# Altium footprint library LUMI_Standard_Auto_Soldering_LIB.PcbLib: 344 footprints (part 2 of 22)
Each footprint in its own frame and in the unit in brackets; x right, y up, seen from the top. Pads: shape width x height; smd on the part's side, far side on the other; paste and mask are expansions set on the pad; w line width, h text height; cw(c..) or ccw(c..) is an arc to the next point about the centre after c.
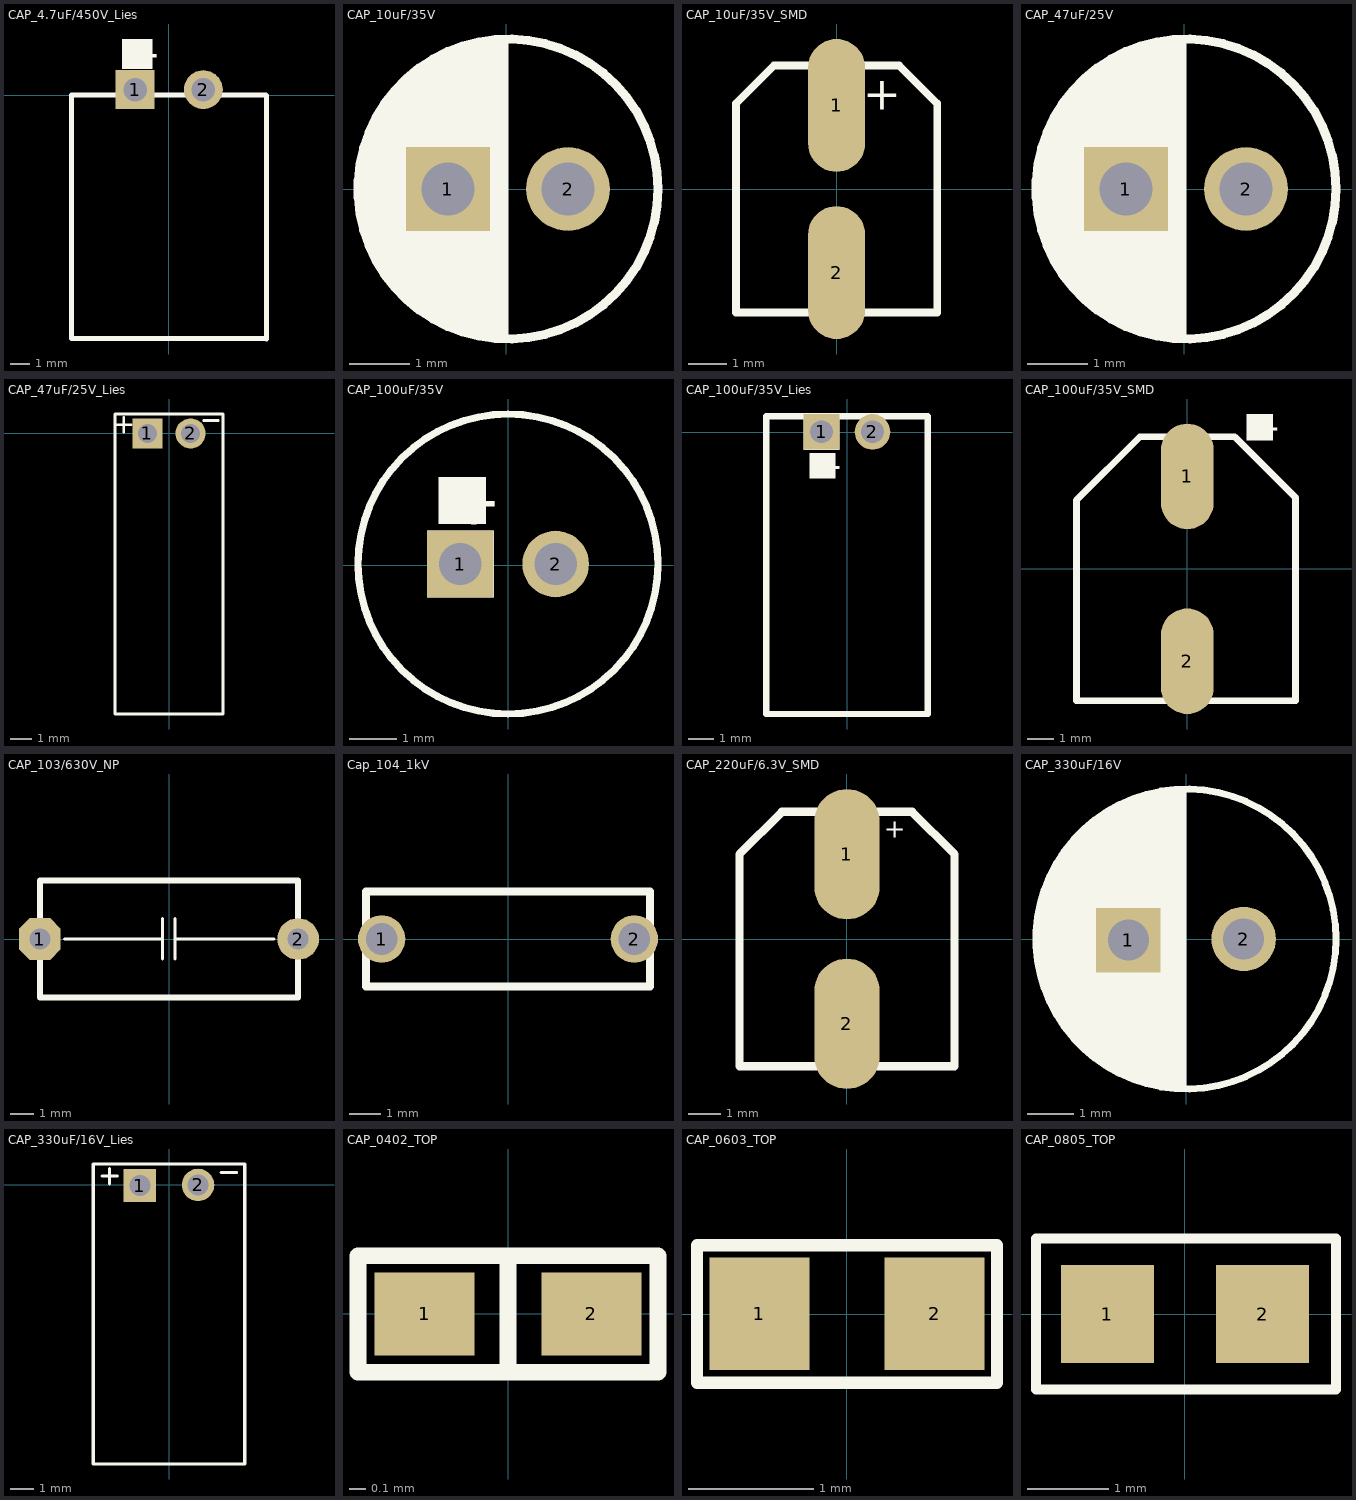
[diagram p1: the footprints below, top view; thin cyan lines are the x and y axes]

## CAP_4.7uF/450V_Lies [mm]
pads (2):
  rect 2x2 hole 1.2: 1(-1.726,0.277)
  round 2 hole 1.2: 2(1.774,0.277)
Top Overlay:
  pour cut-out: -2.378,1.354 -0.854,1.354 -0.854,2.878 -2.378,2.878
  lines w0.254: 5.002,-12.5 -5,-12.5 -5,0 5.002,0 ; 5.025,-12.523 5.025,-0.023
  text "+" at -2.124,1.354 h1.52
3D body: height 9.99, standoff 0.01, extent -4.961,-12.5 5,0
3D body: height 1, standoff -2, extent -2.222,-0.222 -1.226,0.776
3D body: height 1, standoff -2, extent 1.278,-0.222 2.274,0.776

## CAP_10uF/35V [mm]
pads (2):
  rect 1.4x1.4 hole 0.889: 1(-0.975,0)
  round 1.397 hole 0.889: 2(1.025,0)
Top Overlay:
  circle w0.15: c0.025,0 r2.5
  pour cut-out: -1.427,0.842 -0.445,0.842 -0.445,1.824 -1.427,1.824
  pour cut-out: -1.675,-0.7 -0.275,-0.7 -0.275,0.7 -1.675,0.7
  region: -0.025,2.475 0.025,2.454 0.025,-2.5 -0.375,-2.5 -0.475,-2.4 -0.675,-2.4 -0.775,-2.3 -1.075,-2.3 -1.375,-2 -1.575,-2 -1.875,-1.7 -1.875,-1.6 -2.075,-1.4 -2.075,-1.3 -2.275,-1.1 -2.275,-0.9 -2.375,-0.8 -2.375,-0.6 -2.475,-0.5 -2.475,0.4 -2.375,0.5 -2.375,0.825 -2.225,0.975 -2.225,1.2 -2.1,1.325 -2.1,1.4 -2.075,1.4 -1.85,1.625 -1.85,1.75 -1.775,1.75 -1.575,1.95 -1.525,1.95 -1.325,2.15 -1.125,2.15 -0.925,2.35 -0.6,2.35 -0.475,2.475 hole: -0.445,1.824 -1.427,1.824 -1.427,0.842 -0.445,0.842 hole: -0.275,0.7 -1.675,0.7 -1.675,-0.7 -0.275,-0.7
  text "+" at -1.275,0.825 h1.02
3D body: height 0.76, standoff -11.97, extent -2.576,-2.567 2.63,2.577

## CAP_10uF/35V_SMD [mm]
pads (2):
  oval 1.5x3.5 smd: 1(0,2.2) 2(0,-2.2)
Top Overlay:
  lines w0.203: -2.65,-3.25 -2.65,2.25 -1.65,3.25 1.65,3.25 2.65,2.25 2.65,-3.25 -2.65,-3.25
  text "+" at 1.7,1.8 h1.5
3D body: height 5.4, standoff 0, extent -2.5,-2.495 2.48,2.495
3D body: height 1, standoff 0, extent -2.6,-3.3 2.6,3.25

## CAP_47uF/25V [mm]
pads (2):
  rect 1.4x1.4 hole 0.889: 1(-0.975,0)
  round 1.397 hole 0.889: 2(1.025,0)
Top Overlay:
  circle w0.15: c0.025,0 r2.5
  region: -0.025,2.475 0.025,2.454 0.025,-2.5 -0.375,-2.5 -0.475,-2.4 -0.675,-2.4 -0.775,-2.3 -1.075,-2.3 -1.375,-2 -1.575,-2 -1.875,-1.7 -1.875,-1.6 -2.075,-1.4 -2.075,-1.3 -2.275,-1.1 -2.275,-0.9 -2.375,-0.8 -2.375,-0.6 -2.475,-0.5 -2.475,0.4 -2.375,0.5 -2.375,0.825 -2.225,0.975 -2.225,1.2 -2.1,1.325 -2.1,1.4 -2.075,1.4 -1.85,1.625 -1.85,1.75 -1.775,1.75 -1.575,1.95 -1.525,1.95 -1.325,2.15 -1.125,2.15 -0.925,2.35 -0.6,2.35 -0.475,2.475 hole: -0.445,1.824 -1.427,1.824 -1.427,0.842 -0.445,0.842 hole: -0.275,0.7 -1.675,0.7 -1.675,-0.7 -0.275,-0.7
  pour cut-out: -1.675,-0.7 -0.275,-0.7 -0.275,0.7 -1.675,0.7
  pour cut-out: -1.427,0.842 -0.445,0.842 -0.445,1.824 -1.427,1.824
  text "+" at -1.275,0.825 h1.02
3D body: height 0.76, standoff -11.97, extent -2.576,-2.567 2.63,2.577

## CAP_47uF/25V_Lies [mm]
pads (2):
  rect 1.4x1.4 hole 0.889: 1(-1,0)
  round 1.4 hole 0.889: 2(1,0)
Top Overlay:
  lines w0.127: -2.438,0.4 -1.763,0.4 ; -2.1,0.062 -2.1,0.737 ; 1.613,0.6 2.288,0.6
  lines w0.15: -2.5,-13 2.5,-13 2.5,0.9 -2.5,0.9 -2.5,-13
3D body: height -0.43, standoff -5.58, extent -2.606,-12.963 2.6,-0.237

## CAP_100uF/35V [mm]
pads (2):
  rect 1.4x1.4 hole 0.889: 1(-1,0.023)
  round 1.397 hole 0.889: 2(1,0.023)
Top Overlay:
  circle w0.15: c0,0.023 r3.15
  pour cut-out: -1.452,0.865 -0.47,0.865 -0.47,1.847 -1.452,1.847
  pour cut-out: -1.7,-0.677 -0.3,-0.677 -0.3,0.723 -1.7,0.723
  text "+" at -1.3,0.848 h1.02
3D body: height 11, standoff 0, extent -3.125,-3.144 3.15,3.144
3D body: height 1, standoff -2, extent 0.504,-0.476 1.5,0.522
3D body: height 1, standoff -2, extent -1.496,-0.476 -0.5,0.522

## CAP_100uF/35V_Lies [mil]
pads (2):
  rect 55.12x55.12 hole 35: 1(-39.37,0.9)
  round 55 hole 35: 2(39.37,0.9)
Top Overlay:
  pour cut-out: -66.93,-26.66 -11.81,-26.66 -11.81,28.46 -66.93,28.46
  pour cut-out: -57.18,-70.95 -18.53,-70.95 -18.53,-32.29 -57.18,-32.29
  lines w10: -125,-435 125,-435 125,1.89 125,25 -125,25 -125,0 -125,-435
  text "+" at -51.18,-71.62 h40
3D body: height 39.37, standoff -78.74, extent -58.9,-18.74 -19.68,20.55
3D body: height 39.37, standoff -78.74, extent 19.84,-18.74 59.06,20.55
3D body: height 249.76, standoff 2.21, extent -123.03,-433.06 124.02,0.01

## CAP_100uF/35V_SMD [mm]
pads (2):
  oval 2x4 smd: 1(0,3.5) 2(0,-3.5)
Top Overlay:
  pour cut-out: 2.248,4.865 3.229,4.865 3.229,5.847 2.248,5.847
  lines w0.254: -4.2,-5 4.1,-5 4.1,2.7 1.8,5 -1.8,5 -4.2,2.6 -4.2,-5
  text "+" at 2.4,4.848 h1.02
3D body: height 1.6, standoff 0, extent -4.2,-5 4.1,5
3D body: height 10.3, standoff 0.1, extent -3.968,-3.992 4,3.992

## CAP_103/630V_NP [mil]
pads (2):
  oct 70x70 hole 35: 1(-216.54,0)
  round 70 hole 35: 2(216.54,0)
Top Overlay:
  lines w5: -175.2,0 -10.83,0 ; -10.83,-33.46 -10.83,34.45 ; 9.84,-33.46 9.84,34.45 ; 9.84,0 176.18,0
  lines w10: -216.54,-98.43 -216.54,98.43 216.54,98.43 216.54,-98.43 -216.54,-98.43

## Cap_104_1kV [mm]
pads (2):
  round 1.5 hole 1 mask+0.07: 1(-4,0) 2(4,0)
Top Overlay:
  lines w0.254: -4.5,-1.5 -4.5,1.5 4.5,1.5 4.5,-1.5 -4.5,-1.5
3D body: height 12, standoff -2.5, extent -5.498,-1.714 5.498,1.8

## CAP_220uF/6.3V_SMD [mm]
pads (2):
  oval 2x4 smd: 1(0,2.6) 2(0,-2.6)
Top Overlay:
  lines w0.254: -3.3,-3.9 3.3,-3.9 3.3,2.6 2,3.9 -2,3.9 -3.3,2.6 -3.3,-3.9
  text "+" at 1.8,2.9 h1
3D body: height 5.8, standoff 0, extent -3.125,-3.144 3.15,3.144
3D body: height 1, standoff 0, extent -3.3,-3.9 3.3,3.9

## CAP_330uF/16V [mil]
pads (2):
  rect 55x55 hole 35: 1(-49.21,-0.99)
  round 55 hole 35: 2(49.21,0)
Top Overlay:
  circle w5.91: c0,0 r127.95
  region: 0,-126.15 -1.97,-126.97 -20.67,-126.97 -21.65,-125.98 -23.62,-124.02 -34.45,-124.02 -36.42,-122.05 -38.39,-120.08 -47.24,-120.08 -50.2,-117.13 -53.15,-114.17 -61.02,-114.17 -64.96,-110.24 -69.88,-105.31 -73.82,-105.31 -76.77,-102.36 -107.28,-71.85 -107.28,-66.93 -108.27,-66.93 -113.19,-62.01 -115.16,-60.04 -115.16,-56.1 -115.16,-52.17 -118.11,-49.21 -121.06,-46.26 -121.06,-42.32 -121.06,-38.39 -123.03,-36.42 -124.02,-35.43 -124.02,-30.51 -124.02,-26.57 -125.98,-24.61 -126.97,-23.62 -126.97,-18.7 -126.97,-13.78 -127.95,-12.8 -127.95,0 -127.95,11.81 -126.97,12.8 -126.97,21.65 -126.97,24.61 -125,26.57 -123.03,28.54 -123.03,35.43 -123.03,40.35 -120.08,43.31 -118.11,45.28 -118.11,50.2 -118.11,54.13 -116.14,56.1 -112.2,60.04 -112.2,62.99 -112.2,63.98 -108.27,67.91 -106.3,69.88 -106.3,73.82 -101.38,78.74 -96.46,83.66 -96.46,84.65 -89.57,91.54 -85.63,95.47 -83.66,95.47 -73.82,105.31 -70.87,108.27 -66.93,108.27 -62.01,113.19 -60.04,115.16 -51.18,115.16 -48.23,118.11 -46.26,120.08 -37.4,120.08 -32.48,125 -12.8,125 -10.83,126.97 -9.84,127.95 0,127.95 hole: -31.32,76.72 -69.98,76.72 -69.98,38.07 -31.32,38.07 hole: -21.65,26.57 -76.77,26.57 -76.77,-28.54 -21.65,-28.54
  pour cut-out: -76.77,-28.54 -21.65,-28.54 -21.65,26.57 -76.77,26.57
  pour cut-out: -69.98,38.07 -31.32,38.07 -31.32,76.72 -69.98,76.72
  text "+" at -63.98,37.4 h40
3D body: height 29.82, standoff -471.19, extent -101.4,-102.04 103.54,100.48

## CAP_330uF/16V_Lies [mm]
pads (2):
  rect 1.4x1.4 hole 0.889: 1(-1.25,-0.025)
  round 1.4 hole 0.889: 2(1.25,0)
Top Overlay:
  lines w0.127: -2.887,0.375 -2.213,0.375 ; -2.55,0.038 -2.55,0.713 ; 2.238,0.525 2.913,0.525
  lines w0.15: -3.25,-12 -3.25,0.9 3.25,0.9 3.25,-12 -3.25,-12
3D body: height 5.99, standoff 0.01, extent -2.976,-12 3,0
3D body: height -0.43, standoff -5.58, extent -2.606,-11.963 2.6,0.763

## CAP_0402_TOP [mm]
pads (2):
  rect 0.6x0.5 smd: 1(-0.5,0) 2(0.5,0)
Top Overlay:
  lines w0.1: 0,-0.3 0,0.3 ; -0.9,-0.35 -0.9,0.35 0.9,0.35 0.9,-0.35 -0.9,-0.35
3D body: height 0.2, standoff 0, extent -0.5,-0.3 0.5,0.3

## CAP_0603_TOP [mm]
pads (2):
  rect 0.8x0.9 smd: 1(-0.7,0) 2(0.7,0)
Top Overlay:
  lines w0.1: -1.2,-0.55 -1.2,0.55 1.2,0.55 1.2,-0.55 -1.2,-0.55
3D body: height 0.7, standoff 0, extent -0.8,-0.4 0.8,0.4

## CAP_0805_TOP [mm]
pads (2):
  rect 1.14x1.2 smd: 1(-0.95,0) 2(0.95,0)
Top Overlay:
  lines w0.127: -1.825,-0.925 1.85,-0.925 1.85,0.925 -1.825,0.925 -1.825,-0.925
3D body: height 0.8, standoff 0.02, extent -1,-0.624 1,0.625